# Altium footprint library MinervaBots.PcbLib: 162 footprints (part 6 of 11)
Each footprint in its own frame and in the unit in brackets; x right, y up, seen from the top. Pads: shape width x height; smd on the part's side, far side on the other; paste and mask are expansions set on the pad; w line width, h text height; cw(c..) or ccw(c..) is an arc to the next point about the centre after c.
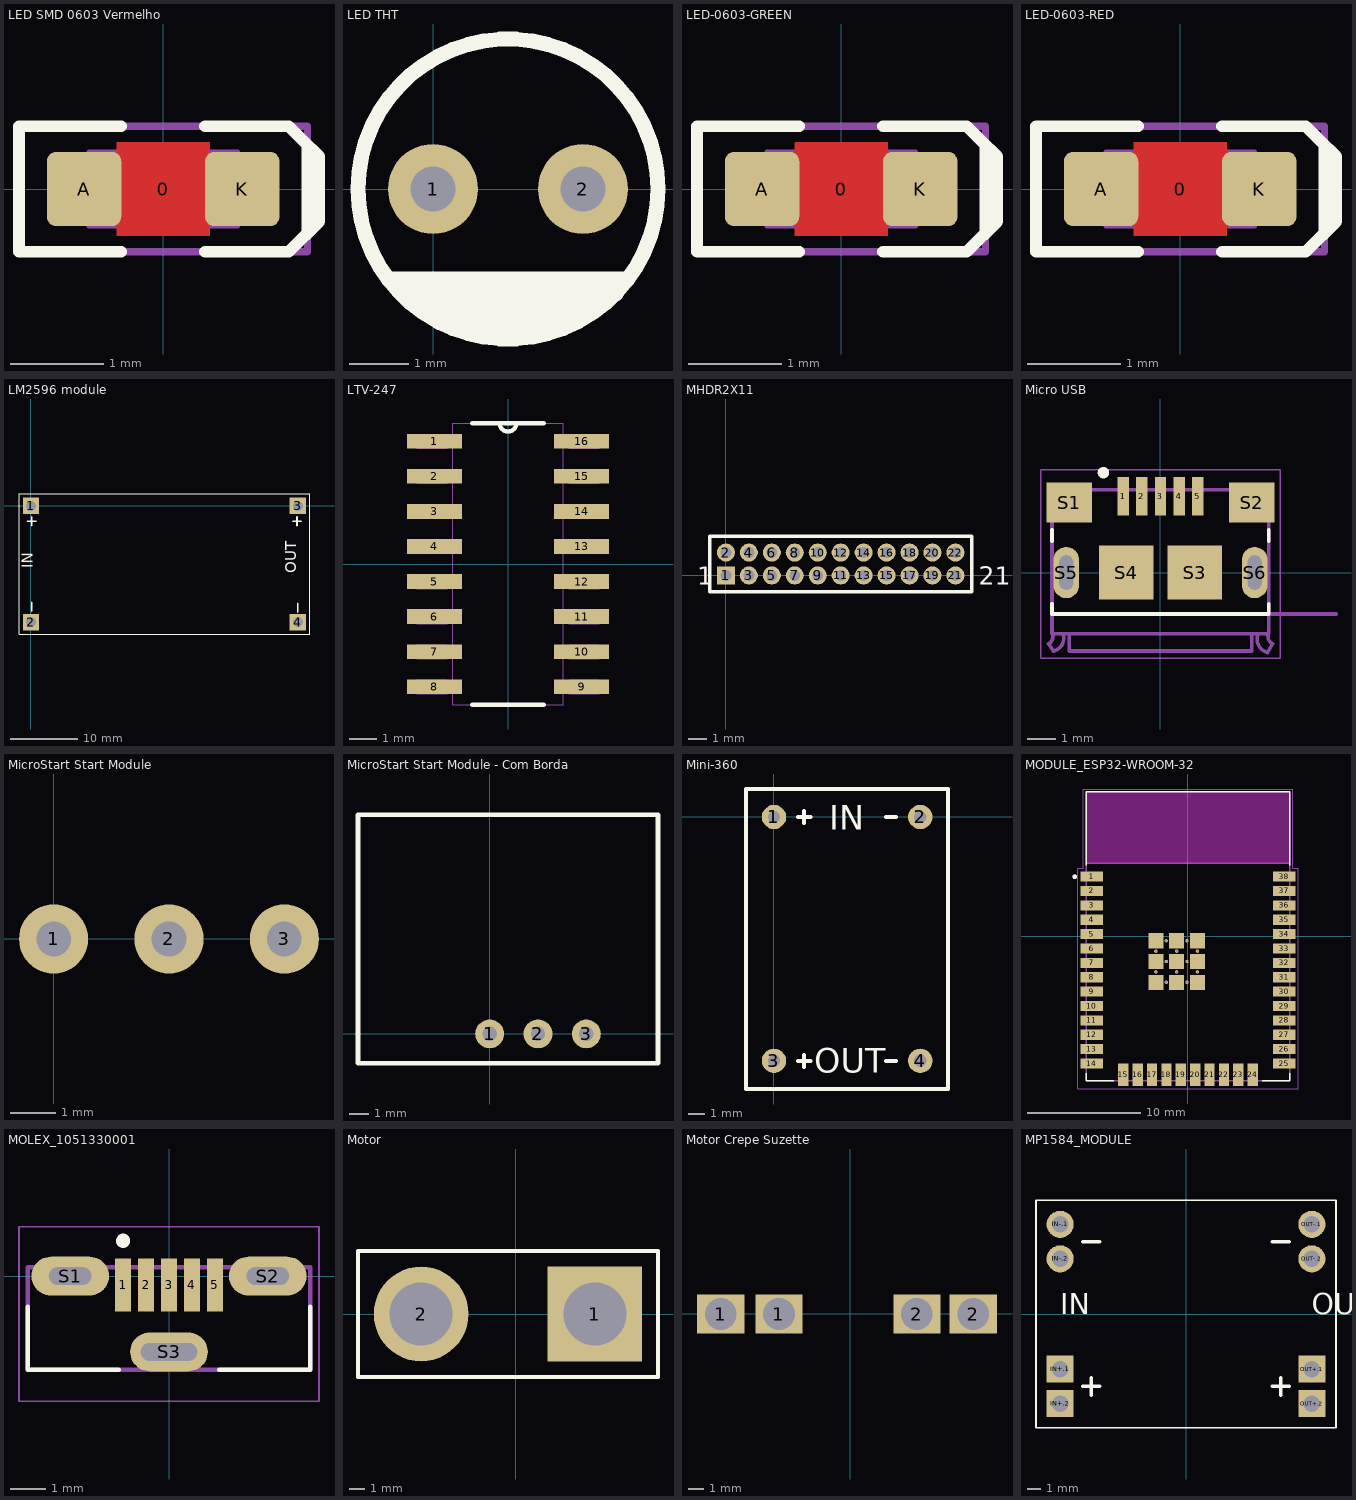
[diagram p5: the footprints below, top view; thin cyan lines are the x and y axes]

## LED SMD 0603 Vermelho [mm]
height 0.8
pads (3):
  round 0.254 on Mech15: 0(0,0)
  rrect25% 0.8x0.8 smd: A(-0.85,0) K(0.85,0)
Top Layer:
  pour cut-out: -0.5,0.5 0.5,0.5 0.5,-0.5 -0.5,-0.5
Top Overlay:
  lines w0.127: -0.45,-0.675 -1.55,-0.675 -1.55,0.675 -0.45,0.675 ; 0.45,-0.675 1.35,-0.675 1.55,-0.475 1.55,0.475 1.35,0.675 0.45,0.675 ; 1.5,0.525 1.675,0.35 1.675,-0.35 1.525,-0.5
Top Designator:
  text ".Designator" at -7.555,-0.508 h1.52
Mechanical 13:
  lines w0.05: -0.6,-0.4 -0.6,0.399 0.6,0.4 0.6,-0.4 -0.6,-0.399 ; -0.505,-0.398 -0.505,0.398 ; -0.5,-0.4 -0.8,-0.4 -0.8,0.4 -0.5,0.4 ; 0.5,-0.4 0.8,-0.4 0.8,0.4 0.5,0.4 ; 0.505,-0.398 0.505,0.398 ; -0.599,-0.398 -0.599,0.398 0.599,0.398 0.599,-0.398 -0.599,-0.398
Mechanical 15:
  lines w0.076: -1.55,-0.675 1.55,-0.675 1.55,0.675 -1.55,0.675 -1.55,-0.675
3D body "LED Vermelho.STEP": height 0.76, standoff 0.01, extent -0.8,-0.4 0.8,0.4

## LED THT [mil]
pads (2):
  round 60 hole 30: 1(0,0) 2(100,0)
Top Overlay:
  circle w10: c50,0 r100
  lines w10: -28,-60 127,-60 ; -18,-70 122,-70 ; -10,-79 106,-79 ; 4,-89 94,-89 ; 31,-94 65,-94
Top Designator:
  text ".Designator" at -249.9,-19.99 h60
3D body "LED (Red).STEP": height 212, standoff -125, extent -28.49,-59 128.51,78.5

## LED-0603-GREEN [mm]
height 0.8
pads (3):
  round 0.254 on Mech15: 0(0,0)
  rrect25% 0.8x0.8 smd: A(-0.85,0) K(0.85,0)
Top Layer:
  pour cut-out: -0.5,0.5 0.5,0.5 0.5,-0.5 -0.5,-0.5
Top Overlay:
  lines w0.127: -0.45,-0.675 -1.55,-0.675 -1.55,0.675 -0.45,0.675 ; 0.45,-0.675 1.35,-0.675 1.55,-0.475 1.55,0.475 1.35,0.675 0.45,0.675 ; 1.5,0.525 1.675,0.35 1.675,-0.35 1.525,-0.5
Top Designator:
  text ".Designator" at -7.555,-0.508 h1.52
Mechanical 13:
  lines w0.05: -0.6,-0.4 -0.6,0.399 0.6,0.4 0.6,-0.4 -0.6,-0.399 ; -0.505,-0.398 -0.505,0.398 ; -0.5,-0.4 -0.8,-0.4 -0.8,0.4 -0.5,0.4 ; 0.5,-0.4 0.8,-0.4 0.8,0.4 0.5,0.4 ; 0.505,-0.398 0.505,0.398 ; -0.599,-0.398 -0.599,0.398 0.599,0.398 0.599,-0.398 -0.599,-0.398
Mechanical 15:
  lines w0.076: -1.55,-0.675 1.55,-0.675 1.55,0.675 -1.55,0.675 -1.55,-0.675
3D body "LED 0603 APT1608 GREEN.STEP": height 0.75, standoff 0, extent -0.8,-0.4 0.8,0.4

## LED-0603-RED [mm]
height 0.8
pads (3):
  round 0.254 on Mech15: 0(0,0)
  rrect25% 0.8x0.8 smd: A(-0.85,0) K(0.85,0)
Top Layer:
  pour cut-out: -0.5,0.5 0.5,0.5 0.5,-0.5 -0.5,-0.5
Top Overlay:
  lines w0.127: -0.45,-0.675 -1.55,-0.675 -1.55,0.675 -0.45,0.675 ; 0.45,-0.675 1.35,-0.675 1.55,-0.475 1.55,0.475 1.35,0.675 0.45,0.675 ; 1.5,0.525 1.675,0.35 1.675,-0.35 1.525,-0.5
Top Designator:
  text ".Designator" at -7.555,-0.508 h1.52
Mechanical 13:
  lines w0.05: -0.6,-0.4 -0.6,0.399 0.6,0.4 0.6,-0.4 -0.6,-0.399 ; -0.505,-0.398 -0.505,0.398 ; -0.5,-0.4 -0.8,-0.4 -0.8,0.4 -0.5,0.4 ; 0.5,-0.4 0.8,-0.4 0.8,0.4 0.5,0.4 ; 0.505,-0.398 0.505,0.398 ; -0.599,-0.398 -0.599,0.398 0.599,0.398 0.599,-0.398 -0.599,-0.398
Mechanical 15:
  lines w0.076: -1.55,-0.675 1.55,-0.675 1.55,0.675 -1.55,0.675 -1.55,-0.675
3D body "LED 0603 APT1608 RED.STEP": height 0.75, standoff 0, extent -0.8,-0.4 0.8,0.4

## LM2596 module [mil]
pads (4):
  rect 95.3x95.3 / inner rect 60x60 / far side rect 95.3x95.3 hole 59.06: 1(0,0) 2(0,-680) 3(1560,0) 4(1560,-680)
Top Overlay:
  lines w5: -70,-750 1630,-750 1630,70 -70,70 -70,-750
  lines w10: -20,-90 30,-90 ; 5,-615 5,-565 ; 5,-115 5,-65 ; 1530,-90 1580,-90 ; 1555,-115 1555,-65 ; 1560,-620 1560,-570
  text "OUT" at 1575,-395 h108.5
  text "IN" at 35,-365 h108.5
Top Designator:
  text ".Designator" at 480.09,-358.3 h60
3D body "LM2596s.STEP": height 606.69, standoff 62.98, extent -76.3,-750.89 1636.29,75.88

## LTV-247 [mil]
pads (16):
  rect 78x21 smd: 1(-104.87,175) 2(-104.87,125) 3(-104.87,75) 4(-104.87,25) 5(-104.87,-25) 6(-104.87,-75) 7(-104.87,-125) 8(-104.87,-175) 9(104.87,-175) 10(104.87,-125) 11(104.87,-75) 12(104.87,-25) 13(104.87,25) 14(104.87,75) 15(104.87,125) 16(104.87,175)
Top Overlay:
  lines w6: -51,-200.94 51,-200.94 ; -51,200.94 -12,200.94 ; 51,200.94 12,200.94 ; -12,200.94 ccw(c0,200.94) 12,200.94 ; -12,200.94 12,200.94
  text "." at -91.54,207.68 h39.37
Top Designator:
  text ".Designator" at -299.9,-9.84 h60
Mechanical 4:
  lines w0: -129.87,-185 -86.87,-185 -129.87,-185 ; -129.87,-185 -129.87,-165 ; -129.87,-185 -129.87,-165 ; -129.87,-165 -86.87,-165 -129.87,-165 ; -129.87,-135 -86.87,-135 -129.87,-135 ; -129.87,-135 -129.87,-115 ; -129.87,-135 -129.87,-115 ; -129.87,-115 -86.87,-115 -129.87,-115 ; -129.87,-85 -86.87,-85 -129.87,-85 ; -129.87,-85 -129.87,-65 ; -129.87,-85 -129.87,-65 ; -129.87,-65 -86.87,-65 -129.87,-65 ; -129.87,-35 -86.87,-35 -129.87,-35 ; -129.87,-35 -129.87,-15 ; -129.87,-35 -129.87,-15 ; -129.87,-15 -86.87,-15 -129.87,-15 ; -129.87,15 -86.87,15 -129.87,15 ; -129.87,15 -129.87,35 ; -129.87,15 -129.87,35 ; -129.87,35 -86.87,35 -129.87,35 ; -129.87,65 -86.87,65 -129.87,65 ; -129.87,65 -129.87,85 ; -129.87,65 -129.87,85 ; -129.87,85 -86.87,85 -129.87,85 ; -129.87,115 -86.87,115 -129.87,115 ; -129.87,115 -129.87,135 ; -129.87,115 -129.87,135 ; -129.87,135 -86.87,135 -129.87,135 ; -129.87,165 -86.87,165 -129.87,165 ; -129.87,165 -129.87,185 ; -129.87,165 -129.87,185 ; -129.87,185 -86.87,185 -129.87,185 ; -79,-200.94 79,-200.94 ; -79,-200.94 79,-200.94 ; -79,-200.94 -79,200.94 ; -79,200.94 -12,200.94 ; -79,200.94 -12,200.94 ; -12,200.94 ccw(c0,200.94) 12,200.94 ; -12,200.94 ccw(c0,200.94) 12,200.94 ; -12,200.94 12,200.94 ; -12,200.94 12,200.94 ; 12,200.94 79,200.94 ; 12,200.94 79,200.94 ; 79,-200.94 79,200.94 ; 129.87,-185 129.87,-165 ; 129.87,-185 86.87,-185 129.87,-185 ; 129.87,-185 129.87,-165 ; 129.87,-165 86.87,-165 129.87,-165 ; 129.87,-135 129.87,-115 ; 129.87,-135 86.87,-135 129.87,-135 ; 129.87,-135 129.87,-115 ; 129.87,-115 86.87,-115 129.87,-115 ; 129.87,-85 129.87,-65 ; 129.87,-85 86.87,-85 129.87,-85 ; 129.87,-85 129.87,-65 ; 129.87,-65 86.87,-65 129.87,-65 ; 129.87,-35 129.87,-15 ; 129.87,-35 86.87,-35 129.87,-35 ; 129.87,-35 129.87,-15 ; 129.87,-15 86.87,-15 129.87,-15 ; 129.87,15 129.87,35 ; 129.87,15 86.87,15 129.87,15 ; 129.87,15 129.87,35 ; 129.87,35 86.87,35 129.87,35 ; 129.87,65 129.87,85 ; 129.87,65 86.87,65 129.87,65 ; 129.87,65 129.87,85 ; 129.87,85 86.87,85 129.87,85 ; 129.87,115 129.87,135 ; 129.87,115 86.87,115 129.87,115 ; 129.87,115 129.87,135 ; 129.87,135 86.87,135 129.87,135 ; 129.87,165 129.87,185 ; 129.87,165 86.87,165 129.87,165 ; 129.87,165 129.87,185 ; 129.87,185 86.87,185 129.87,185 ; -79,-185 -79,-165 -79,-185 ; -79,-135 -79,-115 -79,-135 ; -79,-85 -79,-65 -79,-85 ; -79,-35 -79,-15 -79,-35 ; -79,15 -79,35 -79,15 ; -79,65 -79,85 -79,65 ; -79,115 -79,135 -79,115 ; -79,165 -79,185 -79,165 ; 79,-185 79,-165 79,-185 ; 79,-135 79,-115 79,-135 ; 79,-85 79,-65 79,-85 ; 79,-35 79,-15 79,-35 ; 79,15 79,35 79,15 ; 79,65 79,85 79,65 ; 79,115 79,135 79,115 ; 79,165 79,185 79,165
3D body "CircuitWorks-SO-16.step": height 57, standoff 0, extent -115.11,-195.99 117.38,197.01

## MHDR2X11 [mm] "Connector; Header; 11x2 Position"
pads (22):
  rect 1x1 hole 0.6: 1(0,0)
  round 1 hole 0.6: 2(0,1.27) 3(1.27,0) 4(1.27,1.27) 5(2.54,0) 6(2.54,1.27) 7(3.81,0) 8(3.81,1.27) 9(5.08,0) 10(5.08,1.27) 11(6.35,0) 12(6.35,1.27) 13(7.62,0) 14(7.62,1.27) 15(8.89,0) 16(8.89,1.27) 17(10.16,0) 18(10.16,1.27) 19(11.43,0) 20(11.43,1.27) 21(12.7,0) 22(12.7,1.27)
Top Overlay:
  lines w0.2: -0.9,-0.9 -0.9,2.17 13.6,2.17 13.6,-0.9 -0.9,-0.9
  text "21" at 14,-0.508 h1
  text "1" at -1.6,-0.508 h1
Top Designator:
  text ".Designator" at -0.751,0.127 h1.52

## Micro USB [mm]
pads (13):
  rect 0.4x1.35 smd: 1(-1.3,2.675) 2(-0.65,2.675) 3(0,2.675) 4(0.65,2.675) 5(1.3,2.675)
  rect 1.6x1.4 smd: S1(-3.2,2.45) S2(3.2,2.45)
  rect 1.9x1.9 smd: S3(1.2,0) S4(-1.2,0)
  oval 0.9x1.8 hole 0.5 slot 1.2 at 90 deg: S5(-3.3,0) S6(3.3,0)
  round 0.5 hole 0.5 unplated: ""(-3.3,0) ""(3.3,0)
Top Overlay:
  circle w0.2: c-2,3.5 r0.1
  lines w0.127: -3.8,-1.45 3.8,-1.45 ; -3.8,-1.4 -3.8,-1.1 ; -3.8,1.1 -3.8,1.5 ; 3.8,-1.4 3.8,-1.1 ; 3.8,1.1 3.8,1.5
Top Designator:
  text ".Designator" at -5.951,-0.17 h1.52
Mechanical 13:
  lines w0.127: -3.93,-2.5 -3.75,-2.75 ; -3.93,-2.5 ccw(c-4.065,-2.235) -3.8,-2.1 ; -3.746,-2.749 ccw(c-3.85,-2.3) -3.401,-2.196 ; -3.2,-2.2 -3.2,-2.75 3.2,-2.75 3.2,-2.2 ; 3.401,-2.198 ccw(c3.875,-2.325) 3.748,-2.799 ; 3.75,-2.8 3.93,-2.5 ; 3.8,-2.1 ccw(c4.065,-2.235) 3.93,-2.5 ; 6.15,-1.45 3.8,-1.45 ; -3.8,-2.1 -3.8,-2.15 3.8,-2.15 3.8,-1.45 ; -3.8,-2.1 -3.8,2.9 3.8,2.9 3.8,-1.45
  text "PCB END" at 4.75,-1.3 h0.41
Mechanical 15:
  lines w0.05: -4.2,-3 -4.2,3.6 4.2,3.6 4.2,-3 -4.2,-3
3D body "10118193-0001LF--3DModel-STEP-533217.STEP": height 3.18, standoff -0.43, extent -3.928,-2.8 3.928,2.861

## MicroStart Start Module [mil] "Módulo Start da Jsumo"
pads (3):
  round 60 hole 30: 1(0,0) 2(100,0) 3(200,0)
Top Designator:
  text ".Designator" at -261.66,176.05 h60
3D body "microstart-cad.step": height 558.43, standoff 433.07, extent -266.73,-55.75 343.22,447.83
3D body "PBS-3.step": height 334.65, standoff -118.11, extent -50,-50 250,50
3D body "PLS-3.step": height 551.18, standoff 94.49, extent -50,-50 250,50

## MicroStart Start Module - Com Borda [mil] "Módulo Start da Jsumo"
pads (3):
  round 60 hole 30: 1(0,0) 2(100,0) 3(200,0)
Top Overlay:
  lines w10: -272.64,-61.02 -272.64,453.74 348.43,453.74 348.43,-61.02 -272.64,-61.02
Top Designator:
  text ".Designator" at -262.01,176.36 h60
3D body "PLS-3.step": height 551.18, standoff 94.49, extent -50,-50 250,50
3D body "PBS-3.step": height 334.65, standoff -118.11, extent -50,-50 250,50
3D body "microstart-cad.step": height 558.43, standoff 433.07, extent -266.73,-55.75 343.22,447.83

## Mini-360 [mil]
pads (4):
  round 60 hole 30: 1(0,0) 2(360,0) 3(0,-600) 4(360,-600)
Top Overlay:
  lines w10: 59.06,-600 89.57,-600 ; 59.06,0 89.57,0 ; 73.82,-615.16 73.82,-585.63 ; 73.82,-14.76 73.82,14.76 ; 275.59,-600 300.2,-600 ; 275.59,0 300.2,0 ; -68.9,-669.29 428.15,-669.29 428.15,68.9 -68.9,68.9 -68.9,-669.29
  text "IN" at 135.98,-31.34 h60
  text "OUT" at 99.57,-629.76 h60
Top Designator:
  text ".Designator" at -120.28,-320.19 h60
3D body "PLS-1.step": height 551.18, standoff 94.49, extent 310,-650 410,-550
3D body "PLS-1.step": height 551.18, standoff 94.49, extent -50,-650 50,-550
3D body "PLS-1.step": height 551.18, standoff 94.49, extent 310,-50 410,50
3D body "PLS-1.step": height 551.18, standoff 94.49, extent -50,-50 50,50
3D body "PBS-1.step": height 334.65, standoff -118.11, extent 310,-650 410,-550
3D body "PBS-1.step": height 334.65, standoff -118.11, extent -50,-650 50,-550
3D body "PBS-1.step": height 334.65, standoff -118.11, extent 310,-50 410,50
3D body "PBS-1.step": height 334.65, standoff -118.11, extent -50,-50 50,50
3D body "mini360.step": height 571.05, standoff 405.51, extent -57.45,-656.38 414.99,55.93

## MODULE_ESP32-WROOM-32 [mm]
pads (59):
  rect 2x0.9 smd: 1(-8.5,5.26) 2(-8.5,3.99) 3(-8.5,2.72) 4(-8.5,1.45) 5(-8.5,0.18) 6(-8.5,-1.09) 7(-8.5,-2.36) 8(-8.5,-3.63) 9(-8.5,-4.9) 10(-8.5,-6.17) 11(-8.5,-7.44) 12(-8.5,-8.71) 13(-8.5,-9.98) 14(-8.5,-11.25) 25(8.5,-11.25) 26(8.5,-9.98) 27(8.5,-8.71) 28(8.5,-7.44) 29(8.5,-6.17) 30(8.5,-4.9) 31(8.5,-3.63) 32(8.5,-2.36) 33(8.5,-1.09) 34(8.5,0.18) 35(8.5,1.45) 36(8.5,2.72) 37(8.5,3.99) 38(8.5,5.26)
  rect 0.9x2 smd: 15(-5.715,-12.25) 16(-4.445,-12.25) 17(-3.175,-12.25) 18(-1.905,-12.25) 19(-0.635,-12.25) 20(0.635,-12.25) 21(1.905,-12.25) 22(3.175,-12.25) 23(4.445,-12.25) 24(5.715,-12.25)
  rect 1.33x1.33 smd: 39_1(-2.835,-0.405) 39_2(-1,-0.405) 39_3(0.835,-0.405) 39_4(-2.835,-2.24) 39_5(-1,-2.24) 39_6(0.835,-2.24) 39_7(-2.835,-4.075) 39_8(-1,-4.075) 39_9(0.835,-4.075)
  round 0.3 hole 0.2: 39_10(-1.917,-0.405) 39_11(-0.082,-0.405) 39_12(-2.835,-1.322) 39_13(-1,-1.322) 39_14(0.835,-1.322) 39_15(-1.917,-2.24) 39_16(-0.082,-2.24) 39_17(-2.835,-3.157) 39_18(-1,-3.157) 39_19(0.835,-3.157) 39_20(-1.917,-4.075) 39_21(-0.082,-4.075)
Top Overlay:
  circle w0.2: c-10,5.25 r0.1
  lines w0.127: -9,-12.1 -9,-12.75 -6.55,-12.75 ; -9,6.25 -9,12.75 9,12.75 9,6.25 ; 6.55,-12.75 9,-12.75 9,-12.1
Keep-Out Layer:
  region: 9,6.45 -9,6.45 -9,12.75 9,12.75
  region: 9,6.45 -9,6.45 -9,12.75 9,12.75
Top Designator:
  text ".Designator" at -7.83,-0.758 h1.52
Mechanical 13:
  circle w0.2: c-10,5.25 r0.1
  lines w0.127: -9,6.45 -9,-12.75 9,-12.75 9,6.45 ; -9,6.45 -9,12.75 9,12.75 9,6.45 ; -9,6.45 9,6.45
  text "ANTENNA" at -6,9 h1.78
Mechanical 15:
  lines w0.05: -9.75,-13.5 9.75,-13.5 9.75,6 9.25,6 9.25,13 -9.25,13 -9.25,6 -9.75,6 -9.75,-13.5
3D body "ESP-WROOM-32--3DModel-STEP-56544.STEP": height 3.25, standoff 0, extent -8.95,-12.675 9.05,12.825

## MOLEX_1051330001 [mm]
pads (8):
  rect 0.45x1.5 smd: 1(-1.3,-0.25) 2(-0.65,-0.25) 3(0,-0.25) 4(0.65,-0.25) 5(1.3,-0.25)
  oval 2.2x1.1 hole 0.5 slot 1.2 at 0 deg: S1(-2.8,0) S2(2.8,0)
  oval 2.2x1.1 hole 0.5 slot 1.6 at 0 deg: S3(0,-2.15)
Top Overlay:
  circle w0.2: c-1.3,1 r0.1
  lines w0.127: -4,-0.87 -4,-2.65 -1.42,-2.65 ; 1.42,-2.65 4,-2.65 4,-0.87
Top Designator:
  text ".Designator" at -7.618,-1.583 h1.52
Mechanical 13:
  circle w0.2: c-1.3,1 r0.1
  lines w0.127: -4,-2.65 4,-2.65 4,0.25 -4,0.25 -4,-2.65
Mechanical 15:
  lines w0.05: -4.25,-3.55 4.25,-3.55 4.25,1.4 -4.25,1.4 -4.25,-3.55
3D body "step_temp.STEP": height 6.7, standoff -2.3, extent -4,-2.64 4,0.375

## Motor [mm] "Motor"
pads (2):
  rect 6x6 hole 4: 1(5,0)
  round 6 hole 4: 2(-6,0)
Top Overlay:
  lines w0.254: -10,-4 -10,4 9,4 9,-4 -10,-4
Top Designator:
  text ".Designator" at -8.118,-0.508 h1.52

## Motor Crepe Suzette [mm]
pads (4):
  rect 3x2.5 hole 2: 1(-8.225,0) 1(-4.525,0) 2(4.225,0) 2(7.8,0)

## MP1584_MODULE [mm]
pads (8):
  rect 2x2 hole 1.2: IN+.1(-9.271,-4.064) IN+.2(-9.271,-6.604) OUT+.1(9.271,-4.064) OUT+.2(9.271,-6.604)
  round 2 hole 1.2: IN-.1(-9.271,6.604) IN-.2(-9.271,4.064) OUT-.1(9.271,6.604) OUT-.2(9.271,4.064)
Top Overlay:
  lines w0.127: -11.049,-8.382 11.049,-8.382 11.049,8.382 -11.049,8.382 -11.049,-8.382
  lines w0.254: -7.62,-5.334 -6.35,-5.334 ; -7.62,5.334 -6.35,5.334 ; -6.985,-5.969 -6.985,-4.699 ; 6.35,-5.334 7.62,-5.334 ; 6.35,5.334 7.62,5.334 ; 6.985,-5.969 6.985,-4.699
  text "IN" at -9.271,0 h1.52
  text "OUT" at 9.271,0 h1.52
3D body "step_temp.STEP": height 1.7, standoff 0, extent -2.451,-2.997 2.451,2.997